# Altium footprint library SMT.PcbLib: 325 footprints (part 14 of 21)
Each footprint in its own frame and in the unit in brackets; x right, y up, seen from the top. Pads: shape width x height; smd on the part's side, far side on the other; paste and mask are expansions set on the pad; w line width, h text height; cw(c..) or ccw(c..) is an arc to the next point about the centre after c.
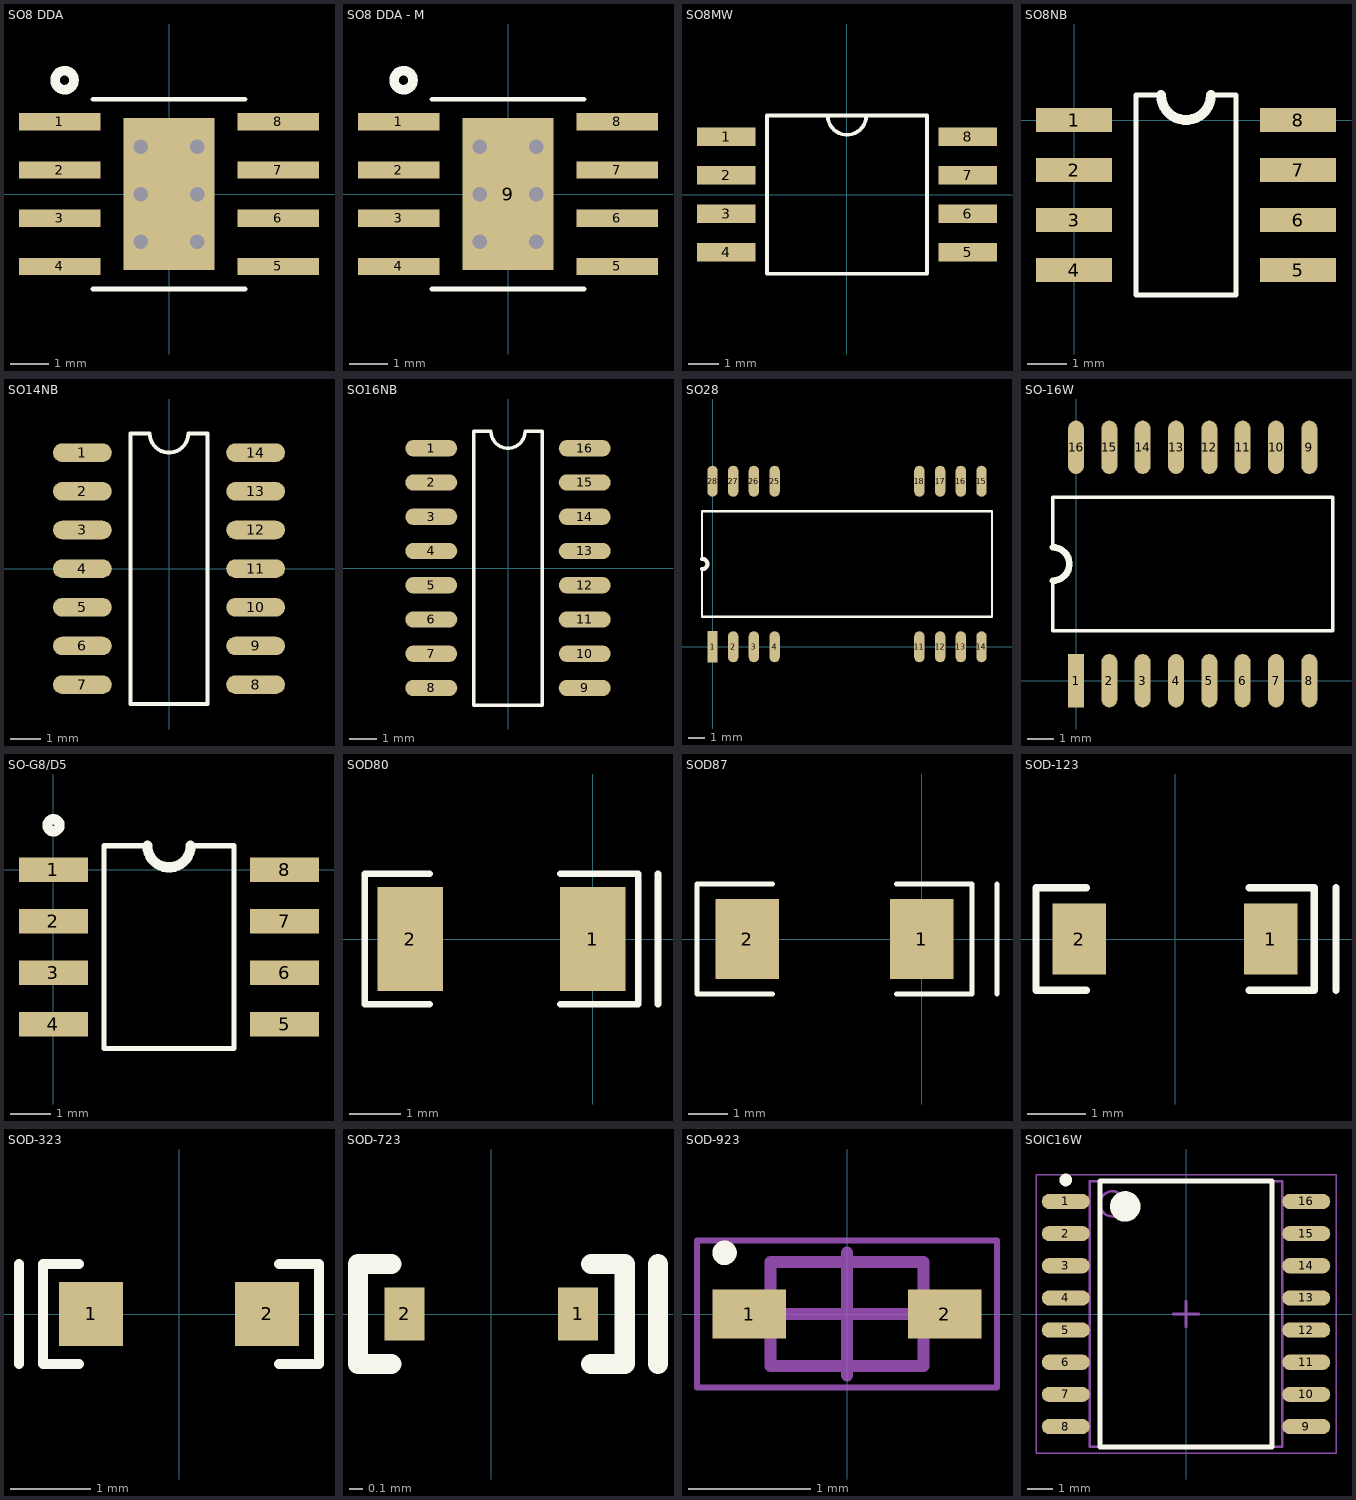
[diagram p13: the footprints below, top view; thin cyan lines are the x and y axes]

## SO8 DDA [mm] "R-PDS0-G8"
height 1.7
pads (9):
  rect 2.15x0.45 smd: 1(-2.875,1.905) 2(-2.875,0.635) 3(-2.875,-0.635) 4(-2.875,-1.905) 5(2.875,-1.905) 6(2.875,-0.635) 7(2.875,0.635) 8(2.875,1.905)
  rect 2.4x4 smd: ""(0,0)
via 0.75,-1.25 diameter 0.762 hole 0.381
via -0.75,-1.25 diameter 0.762 hole 0.381
via 0.75,0 diameter 0.762 hole 0.381
via -0.75,0 diameter 0.762 hole 0.381
via 0.75,1.25 diameter 0.762 hole 0.381
via -0.75,1.25 diameter 0.762 hole 0.381
TopOverlay:
  circle w0.254: c-2.75,3 r0.25
  lines w0.127: -2,-2.5 0,-2.5 2,-2.5 ; -2,2.5 0,2.5 2,2.5
3D body: height 1.7, standoff 0, extent -2,-2.5 2,2.5

## SO8 DDA - M [mm] "R-PDS0-G8  w Heat Sink Pad Pin Number Added"
height 1.7
pads (9):
  rect 2.15x0.45 smd: 1(-2.875,1.905) 2(-2.875,0.635) 3(-2.875,-0.635) 4(-2.875,-1.905) 5(2.875,-1.905) 6(2.875,-0.635) 7(2.875,0.635) 8(2.875,1.905)
  rect 2.4x4 smd: 9(0,0)
via -0.75,1.25 diameter 0.762 hole 0.381
via 0.75,1.25 diameter 0.762 hole 0.381
via -0.75,0 diameter 0.762 hole 0.381
via 0.75,0 diameter 0.762 hole 0.381
via -0.75,-1.25 diameter 0.762 hole 0.381
via 0.75,-1.25 diameter 0.762 hole 0.381
TopOverlay:
  circle w0.254: c-2.75,3 r0.25
  lines w0.127: -2,-2.5 0,-2.5 2,-2.5 ; -2,2.5 0,2.5 2,2.5
3D body: height 1.7, standoff 0, extent -2,-2.5 2,2.5

## SO8MW [mil]
pads (8):
  rect 76x24 smd: 1(-156.5,75) 2(-156.5,25) 3(-156.5,-25) 4(-156.5,-75) 5(156.5,-75) 6(156.5,-25) 7(156.5,25) 8(156.5,75)
TopOverlay:
  lines w5: -25,102.56 ccw(c0,102.56) 25,102.56 ; -103.94,-102.56 103.94,-102.56 103.94,0 103.94,102.56 -103.94,102.56 -103.94,0 -103.94,-102.56
3D body: height 77.56, standoff 0, extent -103.94,-102.56 103.94,102.56

## SO8NB [mil]
pads (8):
  rect 76x24 smd: 1(0,0) 2(0,-50) 3(0,-100) 4(0,-150) 5(224,-150) 6(224,-100) 7(224,-50) 8(224,0)
TopOverlay:
  lines w5: 87,25 62,25 62,-175 162,-175 162,25 137,25
  lines w10: 87,25 ccw(c112,25) 137,25

## SO14NB [mil] "SOIC-14 pin"
pads (14):
  oval 76x24 smd: 1(-112,150) 2(-112,100) 3(-112,50) 4(-112,0) 5(-112,-50) 6(-112,-100) 7(-112,-150) 8(112,-150) 9(112,-100) 10(112,-50) 11(112,0) 12(112,50) 13(112,100) 14(112,150)
TopOverlay:
  lines w5: -50,-175 50,-175 50,175 25,175 cw(c0,175) -25,175 -50,175 -50,-175
3D body: height 68.9, standoff 0, extent -52.94,-177.17 52.94,177.17
3D body: height 32.48, standoff 22.64, extent 52.94,-157.48 84.44,-142.72
3D body: height 32.48, standoff 0, extent 84.44,-157.48 92.31,-142.72
3D body: height 9.84, standoff 0, extent 92.31,-157.48 127.75,-142.72
3D body: height 9.84, standoff 0, extent 92.31,-107.48 127.75,-92.72
3D body: height 32.48, standoff 0, extent 84.44,-107.48 92.31,-92.72
3D body: height 32.48, standoff 22.64, extent 52.94,-107.48 84.44,-92.72
3D body: height 9.84, standoff 0, extent 92.31,-57.48 127.75,-42.72
3D body: height 32.48, standoff 0, extent 84.44,-57.48 92.31,-42.72
3D body: height 32.48, standoff 22.64, extent 52.94,-57.48 84.44,-42.72
3D body: height 9.84, standoff 0, extent 92.31,-7.48 127.75,7.28
3D body: height 32.48, standoff 0, extent 84.44,-7.48 92.31,7.28
3D body: height 32.48, standoff 22.64, extent 52.94,-7.48 84.44,7.28
3D body: height 9.84, standoff 0, extent 92.31,42.52 127.75,57.28
3D body: height 32.48, standoff 0, extent 84.44,42.52 92.31,57.28
3D body: height 32.48, standoff 22.64, extent 52.94,42.52 84.44,57.28
3D body: height 32.48, standoff 22.64, extent -84.44,-157.28 -52.94,-142.52
3D body: height 32.48, standoff 0, extent -92.31,-157.28 -84.44,-142.52
3D body: height 9.84, standoff 0, extent -127.75,-157.28 -92.31,-142.52
3D body: height 9.84, standoff 0, extent -127.75,42.72 -92.31,57.48
3D body: height 32.48, standoff 0, extent -92.31,42.72 -84.44,57.48
3D body: height 32.48, standoff 22.64, extent -84.44,42.72 -52.94,57.48
3D body: height 9.84, standoff 0, extent -127.75,-7.28 -92.31,7.48
3D body: height 32.48, standoff 0, extent -92.31,-7.28 -84.44,7.48
3D body: height 32.48, standoff 22.64, extent -84.44,-7.28 -52.94,7.48
3D body: height 9.84, standoff 0, extent -127.75,-57.28 -92.31,-42.52
3D body: height 32.48, standoff 0, extent -92.31,-57.28 -84.44,-42.52
3D body: height 32.48, standoff 22.64, extent -84.44,-57.28 -52.94,-42.52
3D body: height 9.84, standoff 0, extent -127.75,-107.28 -92.31,-92.52
3D body: height 32.48, standoff 0, extent -92.31,-107.28 -84.44,-92.52
3D body: height 32.48, standoff 22.64, extent -84.44,-107.28 -52.94,-92.52
3D body: height 9.84, standoff 0, extent 92.31,92.52 127.75,107.28
3D body: height 32.48, standoff 0, extent 84.44,92.52 92.31,107.28
3D body: height 32.48, standoff 22.64, extent 52.94,92.52 84.44,107.28
3D body: height 9.84, standoff 0, extent 92.31,142.52 127.75,157.28
3D body: height 32.48, standoff 0, extent 84.44,142.52 92.31,157.28
3D body: height 32.48, standoff 22.64, extent 52.94,142.52 84.44,157.28
3D body: height 32.48, standoff 22.64, extent -84.44,142.72 -52.94,157.48
3D body: height 32.48, standoff 0, extent -92.31,142.72 -84.44,157.48
3D body: height 9.84, standoff 0, extent -127.75,142.72 -92.31,157.48
3D body: height 10, standoff 0, extent 0,-206.69 0,-206.69
3D body: height 9.84, standoff 0, extent -127.75,92.72 -92.31,107.48
3D body: height 32.48, standoff 0, extent -92.31,92.72 -84.44,107.48
3D body: height 32.48, standoff 22.64, extent -84.44,92.72 -52.94,107.48

## SO16NB [mil]
pads (16):
  oval 76x24 smd: 1(-112,175) 2(-112,125) 3(-112,75) 4(-112,25) 5(-112,-25) 6(-112,-75) 7(-112,-125) 8(-112,-175) 9(112,-175) 10(112,-125) 11(112,-75) 12(112,-25) 13(112,25) 14(112,75) 15(112,125) 16(112,175)
TopOverlay:
  lines w5: -50,-200 50,-200 50,200 25,200 cw(c0,200) -25,200 -50,200 -50,-200
3D body: height 32.48, standoff 22.64, extent -84.44,-82.28 -52.94,-67.52
3D body: height 32.48, standoff 0, extent -92.31,-82.28 -84.44,-67.52
3D body: height 9.84, standoff 0, extent -127.75,-82.28 -92.31,-67.52
3D body: height 32.48, standoff 22.64, extent -84.44,-32.28 -52.94,-17.52
3D body: height 32.48, standoff 0, extent -92.31,-32.28 -84.44,-17.52
3D body: height 9.84, standoff 0, extent -127.75,-32.28 -92.31,-17.52
3D body: height 32.48, standoff 22.64, extent -84.44,17.72 -52.94,32.48
3D body: height 32.48, standoff 0, extent -92.31,17.72 -84.44,32.48
3D body: height 9.84, standoff 0, extent -127.75,17.72 -92.31,32.48
3D body: height 32.48, standoff 22.64, extent -84.44,67.72 -52.94,82.48
3D body: height 32.48, standoff 0, extent -92.31,67.72 -84.44,82.48
3D body: height 9.84, standoff 0, extent -127.75,67.72 -92.31,82.48
3D body: height 32.48, standoff 22.64, extent -84.44,117.72 -52.94,132.48
3D body: height 32.48, standoff 0, extent -92.31,117.72 -84.44,132.48
3D body: height 9.84, standoff 0, extent -127.75,117.72 -92.31,132.48
3D body: height 68.9, standoff 0, extent -52.94,-201.77 52.94,202.17
3D body: height 9.84, standoff 0, extent -127.75,167.72 -92.31,182.48
3D body: height 32.48, standoff 0, extent -92.31,167.72 -84.44,182.48
3D body: height 32.48, standoff 22.64, extent -84.44,167.72 -52.94,182.48
3D body: height 9.84, standoff 0, extent -127.75,-132.28 -92.31,-117.52
3D body: height 32.48, standoff 0, extent -92.31,-132.28 -84.44,-117.52
3D body: height 32.48, standoff 22.64, extent -84.44,-132.28 -52.94,-117.52
3D body: height 32.48, standoff 22.64, extent 52.94,167.52 84.44,182.28
3D body: height 32.48, standoff 0, extent 84.44,167.52 92.31,182.28
3D body: height 9.84, standoff 0, extent 92.31,167.52 127.75,182.28
3D body: height 32.48, standoff 22.64, extent 52.94,117.52 84.44,132.28
3D body: height 32.48, standoff 0, extent 84.44,117.52 92.31,132.28
3D body: height 9.84, standoff 0, extent 92.31,117.52 127.75,132.28
3D body: height 32.48, standoff 22.64, extent 52.94,67.52 84.44,82.28
3D body: height 32.48, standoff 0, extent 84.44,67.52 92.31,82.28
3D body: height 9.84, standoff 0, extent 92.31,67.52 127.75,82.28
3D body: height 32.48, standoff 22.64, extent 52.94,17.52 84.44,32.28
3D body: height 32.48, standoff 0, extent 84.44,17.52 92.31,32.28
3D body: height 9.84, standoff 0, extent 92.31,17.52 127.75,32.28
3D body: height 32.48, standoff 22.64, extent 52.94,-32.48 84.44,-17.72
3D body: height 32.48, standoff 0, extent 84.44,-32.48 92.31,-17.72
3D body: height 9.84, standoff 0, extent 92.31,-32.48 127.75,-17.72
3D body: height 32.48, standoff 22.64, extent 52.94,-82.48 84.44,-67.72
3D body: height 32.48, standoff 0, extent 84.44,-82.48 92.31,-67.72
3D body: height 9.84, standoff 0, extent 92.31,-82.48 127.75,-67.72
3D body: height 9.84, standoff 0, extent 92.31,-132.48 127.75,-117.72
3D body: height 32.48, standoff 0, extent 84.44,-132.48 92.31,-117.72
3D body: height 32.48, standoff 22.64, extent 52.94,-132.48 84.44,-117.72
3D body: height 32.48, standoff 22.64, extent -84.44,-182.28 -52.94,-167.52
3D body: height 32.48, standoff 0, extent -92.31,-182.28 -84.44,-167.52
3D body: height 9.84, standoff 0, extent -127.75,-182.28 -92.31,-167.52
3D body: height 32.48, standoff 22.64, extent 52.94,-182.48 84.44,-167.72
3D body: height 32.48, standoff 0, extent 84.44,-182.48 92.31,-167.72
3D body: height 9.84, standoff 0, extent 92.31,-182.48 127.75,-167.72

## SO28 [mm]
pads (16):
  rect 0.635x1.905 smd: 1(0,0)
  oval 0.635x1.905 smd: 2(1.27,0) 3(2.54,0) 4(3.81,0) 11(12.7,0) 12(13.97,0) 13(15.24,0) 14(16.51,0) 15(16.51,10.16) 16(15.24,10.16) 17(13.97,10.16) 18(12.7,10.16) 25(3.81,10.16) 26(2.54,10.16) 27(1.27,10.16) 28(0,10.16)
TopOverlay:
  lines w0.127: -0.635,4.763 -0.635,1.841 17.145,1.841 17.145,8.319 -0.635,8.319 -0.635,5.397
  lines w0.254: -0.635,4.763 ccw(c-0.635,5.08) -0.635,5.397

## SO-16W [mil]
pads (16):
  rect 24x80 smd: 1(0,0)
  oval 24x80 smd: 2(50,0) 3(100,0) 4(150,0) 5(200,0) 6(250,0) 7(300,0) 8(350,0) 9(350,350) 10(300,350) 11(250,350) 12(200,350) 13(150,350) 14(100,350) 15(50,350) 16(0,350)
TopOverlay:
  lines w5: -35,150 -35,75 385,75 385,275 -35,275 -35,200
  lines w10: -35,150 ccw(c-35,175) -35,200

## SO-G8/D5 [mm]
pads (8):
  rect 1.7x0.6 smd: 1(0,0) 2(0,-1.27) 3(0,-2.54) 4(0,-3.81) 5(5.7,-3.81) 6(5.7,-2.54) 7(5.7,-1.27) 8(5.7,0)
TopOverlay:
  circle w0.25: c0,1.1 r0.15
  lines w0.127: 2.317,0.595 1.25,0.595 1.25,-4.405 4.45,-4.405 4.45,0.595 3.383,0.595
  lines w0.25: 2.317,0.595 ccw(c2.85,0.595) 3.383,0.595

## SOD80 [mil]
pads (2):
  rect 50x80 smd: 1(0,0) 2(-140,0)
TopOverlay:
  lines w5: -125,-50 -175,-50 -175,50 -125,50 ; -25,-50 35,-50 35,50 -25,50 ; 50,-50 50,50

## SOD87 [mil]
pads (2):
  rect 63x80 smd: 1(0,0) 2(-174,0)
TopOverlay:
  lines w5: -149,-55 -224,-55 -224,55 -149,55 ; -25,-55 50,-55 50,55 -25,55 ; 75,-55 75,55

## SOD-123 [mm] "DIODE"
pads (2):
  rect 0.91x1.22 smd: 1(1.635,0) 2(-1.635,0)
TopOverlay:
  lines w0.127: -1.52,-0.875 -2.375,-0.875 -2.375,0.875 -1.52,0.875 ; 1.266,-0.875 2.375,-0.875 2.375,0.875 1.266,0.875 ; 2.75,-0.875 2.75,0.875
3D body: height 1.35, standoff 0, extent -1.35,-0.8 1.35,0.8

## SOD-323 [mm]
height 0.9
pads (2):
  rect 0.8x0.8 smd: 1(-1.1,0) 2(1.1,0)
TopOverlay:
  lines w0.127: -2,-0.625 -2,0.625 ; -1.25,-0.625 -1.7,-0.625 -1.7,0.625 -1.25,0.625 ; 1.25,-0.625 1.75,-0.625 1.75,0.625 1.25,0.625
3D body: height 0.9, standoff 0, extent -0.85,-0.625 0.85,0.625

## SOD-723 [mm]
pads (2):
  rect 0.3x0.4 smd: 1(0.65,0) 2(-0.65,0)
TopOverlay:
  lines w0.152: -0.75,-0.375 -1,-0.375 -1,0.375 -0.75,0.375 ; 0.75,-0.375 1,-0.375 1,0.375 0.75,0.375 ; 1.25,-0.375 1.25,0.375
3D body: height 0.8, standoff 0, extent -0.5,-0.325 0.5,0.325

## SOD-923 [mm] "SODFL, 2-Leads, Body 0.80x1.60mm, IPC Medium Density"
height 0.6
pads (2):
  rect 0.6x0.4 smd: 1(-0.8,0) 2(0.8,0)
TopOverlay:
  circle w0.1: c-1,0.5 r0.05
Mechanical13:
  lines w0.1: -0.625,-0.425 -0.625,0.425 0.625,0.425 0.625,-0.425 -0.625,-0.425
Mechanical15:
  lines w0.05: -1.225,-0.6 -1.225,0.6 1.225,0.6 1.225,-0.6 -1.225,-0.6
  lines w0.1: -0.5,0 0.5,0 ; 0,-0.5 0,0.5
3D body: height 0.6, standoff 0, extent -0.625,-0.425 0.625,0.425

## SOIC16W [mm] "SOIC, 16-Leads, Body 10.25x7.50mm, Pitch 1.27mm, IPC Medium Density"
height 2.65
pads (16):
  oval 1.9x0.6 smd: 1(-4.75,4.445) 2(-4.75,3.175) 3(-4.75,1.905) 4(-4.75,0.635) 5(-4.75,-0.635) 6(-4.75,-1.905) 7(-4.75,-3.175) 8(-4.75,-4.445) 9(4.75,-4.445) 10(4.75,-3.175) 11(4.75,-1.905) 12(4.75,-0.635) 13(4.75,0.635) 14(4.75,1.905) 15(4.75,3.175) 16(4.75,4.445)
TopOverlay:
  circle w0.25: c-4.75,5.295 r0.125
  circle w0.6: c-2.4,4.25 r0.3
  lines w0.2: -3.4,-5.25 -3.4,5.25 3.4,5.25 3.4,-5.25 -3.4,-5.25
Mechanical13:
  circle w0.1: c-2.9,4.35 r0.5
  lines w0.1: -3.8,-5.25 -3.8,5.25 3.8,5.25 3.8,-5.25 -3.8,-5.25
Mechanical15:
  lines w0.05: -5.925,-5.5 -5.925,5.5 5.925,5.5 5.925,-5.5 -5.925,-5.5
  lines w0.1: -0.5,0 0.5,0 ; 0,-0.5 0,0.5
3D body: height 2.65, standoff 0.1, extent -3.8,-5.25 3.8,5.25